# Altium schematic symbol library 13-Logicold 逻辑 IC.SchLib: 297 symbols (part 5 of 30)
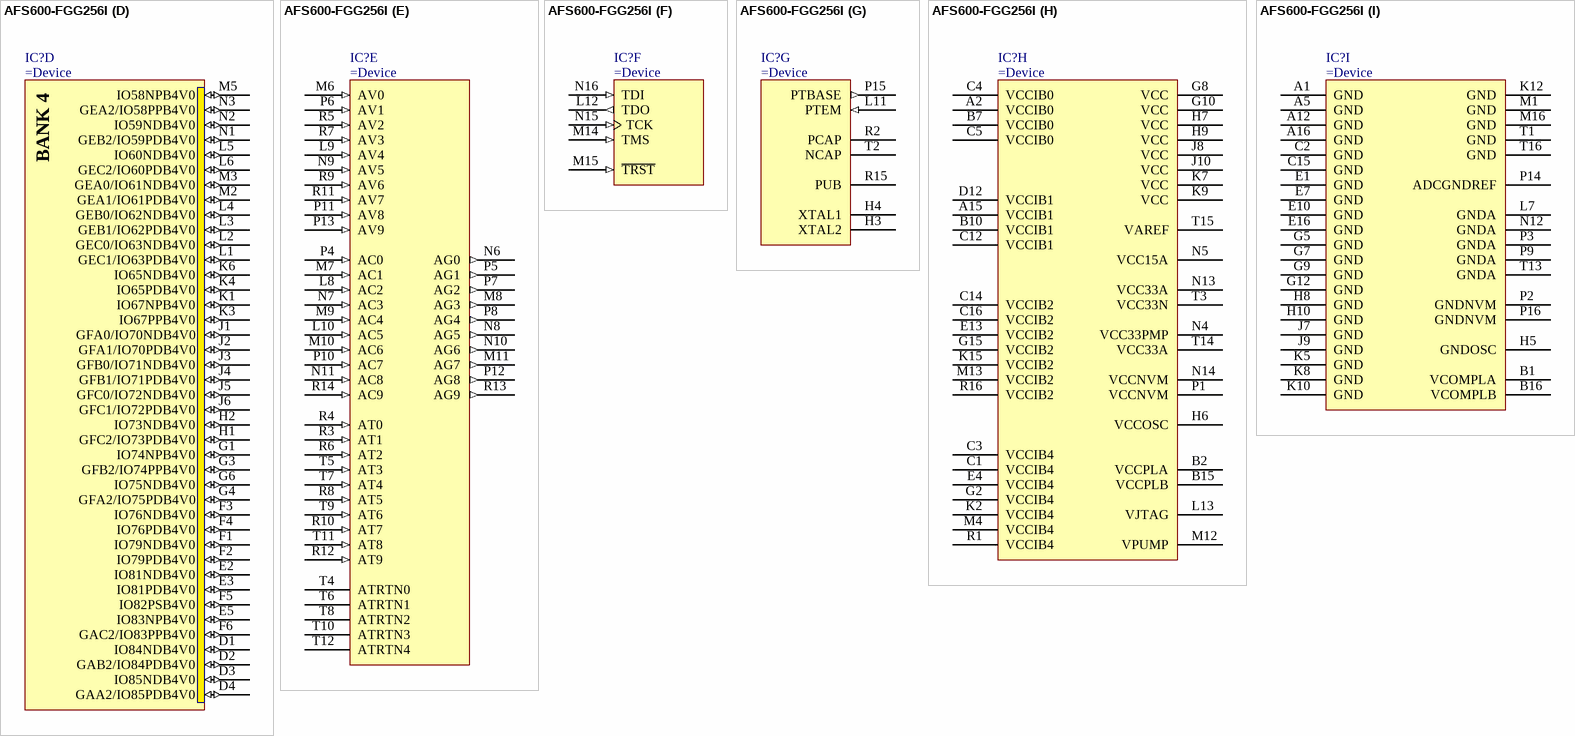
[diagram p166: symbol AFS600-FGG256I]

## AFS600-FGG256I
designator IC?
3.3V Fusion Mixed Signal Flash FPGA, 600,000 System Gates, 256-Pin FBGA, Industrial Grade, Pb-Free
part A pins: A3 GAA0/IO01NDB0V0 (io), A4 GAA1/IO01PDB0V0 (io), A6 IO10PDB0V1 (io), A7 IO12PDB0V1 (io), A8 IO12NDB0V1 (io), B3 IO00NDB0V0 (io), B4 IO00PDB0V0 (io), B5 GAB1/IO02PPB0V0 (io), B6 IO10NDB0V1 (io), C6 GAC1/IO03PDB0V0 (io), C7 IO06NDB0V0 (io), D5 GAB0/IO02NPB0V0 (io), D6 GAC0/IO03NDB0V0 (io), D7 IO06PDB0V0 (io), D8 IO14NDB0V1 (io), D9 IO14PDB0V1 (io), E6 IO04NPB0V0 (io), E8 IO08PDB0V1 (io), F7 IO04PPB0V0 (io), F8 IO08NDB0V1 (io)
part B pins: A9 IO22NDB1V0 (io), A10 IO22PDB1V0 (io), A11 IO24NDB1V1 (io), A13 GBA0/IO28NDB1V1 (io), A14 IO29NDB1V1 (io), B8 IO18NDB1V0 (io), B9 IO18PDB1V0 (io), B11 IO24PDB1V1 (io), B12 GBC0/IO26NPB1V1 (io), B13 GBA1/IO28PDB1V1 (io), B14 IO29PDB1V1 (io), C8 IO16PDB1V0 (io), C9 IO16NDB1V0 (io), C10 IO25NDB1V1 (io), C11 IO25PDB1V1 (io), C13 GBC1/IO26PPB1V1 (io), D10 IO23PDB1V1 (io), D11 GBB0/IO27NDB1V1 (io), E9 IO20NDB1V0 (io), E11 GBB1/IO27PDB1V1 (io), F9 IO20PDB1V0 (io), F10 IO23NDB1V1 (io)
part C pins: D13 GBA2/IO30PDB2V0 (io), D14 IO30NDB2V0 (io), D15 GBB2/IO31PDB2V0 (io), D16 IO31NDB2V0 (io), E12 IO33PSB2V0 (io), E14 IO32NDB2V0 (io), E15 GBC2/IO32PDB2V0 (io), F11 IO36NDB2V0 (io), F12 IO36PDB2V0 (io), F13 IO39NDB2V0 (io), F14 GCA2/IO39PDB2V0 (io), F15 GCB2/IO40PDB2V0 (io), F16 IO40NDB2V0 (io), G11 GCC0/IO43NDB2V0 (io), G13 GCC1/IO43PDB2V0 (io), G14 IO41NPB2V0 (io), G16 GCC2/IO41PPB2V0 (io), H11 IO47NDB2V0 (io), H12 IO47PDB2V0 (io), H13 GCA1/IO45PDB2V0 (io), H14 GCA0/IO45NDB2V0 (io), H15 GCB0/IO44NDB2V0 (io), H16 GCB1/IO44PDB2V0 (io), J11 IO56NPB2V0 (io), J12 GDB0/IO53NPB2V0 (io), J13 GDA1/IO54PDB2V0 (io), J14 GDC1/IO52PPB2V0 (io), J15 IO51NSB2V0 (io), J16 GDC0/IO52NPB2V0 (io), K11 GDC2/IO57PPB2V0 (io), K13 GDA0/IO54NDB2V0 (io), K14 GDA2/IO55PPB2V0 (io), K16 GDB1/IO53PPB2V0 (io), L14 IO57NPB2V0 (io), L15 GDB2/IO56PPB2V0 (io), L16 IO55NPB2V0 (io)
part D pins: D1 IO84NDB4V0 (io), D2 GAB2/IO84PDB4V0 (io), D3 IO85NDB4V0 (io), D4 GAA2/IO85PDB4V0 (io), E2 IO81NDB4V0 (io), E3 IO81PDB4V0 (io), E5 IO83NPB4V0 (io), F1 IO79NDB4V0 (io), F2 IO79PDB4V0 (io), F3 IO76NDB4V0 (io), F4 IO76PDB4V0 (io), F5 IO82PSB4V0 (io), F6 GAC2/IO83PPB4V0 (io), G1 IO74NPB4V0 (io), G3 GFB2/IO74PPB4V0 (io), G4 GFA2/IO75PDB4V0 (io), G6 IO75NDB4V0 (io), H1 GFC2/IO73PDB4V0 (io), H2 IO73NDB4V0 (io), J1 GFA0/IO70NDB4V0 (io), J2 GFA1/IO70PDB4V0 (io), J3 GFB0/IO71NDB4V0 (io), J4 GFB1/IO71PDB4V0 (io), J5 GFC0/IO72NDB4V0 (io), J6 GFC1/IO72PDB4V0 (io), K1 IO67NPB4V0 (io), K3 IO67PPB4V0 (io), K4 IO65PDB4V0 (io), K6 IO65NDB4V0 (io), L1 GEC1/IO63PDB4V0 (io), L2 GEC0/IO63NDB4V0 (io), L3 GEB1/IO62PDB4V0 (io), L4 GEB0/IO62NDB4V0 (io), L5 IO60NDB4V0 (io), L6 GEC2/IO60PDB4V0 (io), M2 GEA1/IO61PDB4V0 (io), M3 GEA0/IO61NDB4V0 (io), M5 IO58NPB4V0 (io), N1 GEB2/IO59PDB4V0 (io), N2 IO59NDB4V0 (io), N3 GEA2/IO58PPB4V0 (io)
part E pins: L8 AC2 (in) "Analog current pad 2.", L9 AV4 (in) "Analog voltage pad 4.", L10 AC5 (in) "Analog current pad 5.", M6 AV0 (in) "Analog voltage pad 0.", M7 AC1 (in) "Analog current pad 1.", M8 AG3 (out) "Analog gate driver pad 3.", M9 AC4 (in) "Analog current pad 4.", M10 AC6 (in) "Analog current pad 6.", M11 AG7 (out) "Analog gate driver pad 7.", N6 AG0 (out) "Analog gate driver pad 0.", N7 AC3 (in) "Analog current pad 3.", N8 AG5 (out) "Analog gate driver pad 5.", N9 AV5 (in) "Analog voltage pad 5.", N10 AG6 (out) "Analog gate driver pad 6.", N11 AC8 (in) "Analog current pad 8.", P4 AC0 (in) "Analog current pad 0.", P5 AG1 (out) "Analog gate driver pad 1.", P6 AV1 (in) "Analog voltage pad 1.", P7 AG2 (out) "Analog gate driver pad 2.", P8 AG4 (out) "Analog gate driver pad 4.", P10 AC7 (in) "Analog current pad 7.", P11 AV8 (in) "Analog voltage pad 8.", P12 AG8 (out) "Analog gate driver pad 8.", P13 AV9 (in) "Analog voltage pad 9.", R3 AT1 (in) "Analog temperature pad 1.", R4 AT0 (in) "Analog temperature pad 0.", R5 AV2 (in) "Analog voltage pad 2.", R6 AT2 (in) "Analog temperature pad 2.", R7 AV3 (in) "Analog voltage pad 3.", R8 AT5 (in) "Analog temperature pad 5.", R9 AV6 (in) "Analog voltage pad 6.", R10 AT7 (in) "Analog temperature pad 7.", R11 AV7 (in) "Analog voltage pad 7.", R12 AT9 (in) "Analog temperature pad 9.", R13 AG9 (out) "Analog gate driver pad 9.", R14 AC9 (in) "Analog current pad 9.", T4 ATRTN0 "Temperature monitor return 0.", T5 AT3 (in) "Analog temperature pad 3.", T6 ATRTN1 "Temperature monitor return 1.", T7 AT4 (in) "Analog temperature pad 4.", T8 ATRTN2 "Temperature monitor return 2.", T9 AT6 (in) "Analog temperature pad 6.", T10 ATRTN3 "Temperature monitor return 3.", T11 AT8 (in) "Analog temperature pad 8.", T12 ATRTN4 "Temperature monitor return 4."
part F pins: L12 TDO (out), M14 TMS (in), M15 ~{TRST} (in), N15 TCK (in), N16 TDI (in)
part G pins: H3 XTAL2 "Input to crystal oscillator - If using external RC network or clock input, XTAL1 should be used and XTAL2 left unconnected.", H4 XTAL1 "Input to crystal oscillator - If using external RC network or clock input, XTAL1 should be used and XTAL2 left unconnected.", L11 PTEM (in) "PASS TRANSISTOR EMITTER - The feedback input of the voltage regulator.", P15 PTBASE (out) "PASS TRANSISTOR BASE - The control signal of the voltage regulator.", R2 PCAP "POSITIVE CAPACITOR - where the positive terminal of the charge pump capacitor is connected.", R15 PUB "Power up bar - for the external momentary switch which turns on the 1.5V regulator.", T2 NCAP "NEGATIVE CAPACITOR - where the negative terminal of the charge pump capacitor is connected."
part H pins: A2 VCCIB0 (power), A15 VCCIB1 (power), B2 VCCPLA (power), B7 VCCIB0 (power), B10 VCCIB1 (power), B15 VCCPLB (power), C1 VCCIB4 (power), C3 VCCIB4 (power) "Quiet supply voltage to the input buffers of bank 4.", C4 VCCIB0 (power) "Quiet supply voltage to the input buffers of bank 0.", C5 VCCIB0 (power), C12 VCCIB1 (power), C14 VCCIB2 (power) "Quiet supply voltage to the input buffers of bank 2.", C16 VCCIB2 (power), D12 VCCIB1 (power) "Quiet supply voltage to the input buffers of bank 1.", E4 VCCIB4 (power), E13 VCCIB2 (power), G2 VCCIB4 (power), G8 VCC (power), G10 VCC (power), G15 VCCIB2 (power), H6 VCCOSC (power), H7 VCC (power), H9 VCC (power), J8 VCC (power), J10 VCC (power), K2 VCCIB4 (power), K7 VCC (power), K9 VCC (power), K15 VCCIB2 (power), L13 VJTAG (power), M4 VCCIB4 (power), M12 VPUMP (power), M13 VCCIB2 (power), N4 VCC33PMP (power) "3.3V clean analog power supply input for use by the analog charge pump.", N5 VCC15A (power), N13 VCC33A (power), N14 VCCNVM (power) "1.5V power supply used by the Fusion device's Flash memory block module(s).", P1 VCCNVM (power) "1.5V power supply used by the Fusion device's Flash memory block module(s).", R1 VCCIB4 (power), R16 VCCIB2 (power), T3 VCC33N (power) "-3.3V output from the voltage converter. A 2.2µF capacitor must be connected from this pin to ground.", T14 VCC33A (power) "Analog power pin for the analog power supply low pass filter. An external 1µF capacitor should be connected between this pin and ground.", T15 VAREF (power) "Analog reference voltage to be used by analog to digital converter."
part I pins: A1 GND (power), A5 GND (power), A12 GND (power), A16 GND (power), B1 VCOMPLA (power), B16 VCOMPLB (power), C2 GND (power), C15 GND (power), E1 GND (power), E7 GND (power), E10 GND (power), E16 GND (power), G5 GND (power), G7 GND (power), G9 GND (power), G12 GND (power), H5 GNDOSC (power) "Oscillator ground.", H8 GND (power), H10 GND (power), J7 GND (power), J9 GND (power), K5 GND (power), K8 GND (power), K10 GND (power), K12 GND (power), L7 GNDA (power), M1 GND (power), M16 GND (power), N12 GNDA (power), P2 GNDNVM (power) "Flash memory ground.", P3 GNDA (power), P9 GNDA (power), P14 ADCGNDREF (power) "Analog ground reference used by the ADC.", P16 GNDNVM (power) "Flash memory ground.", T1 GND (power), T13 GNDA (power), T16 GND (power)
part A text: BANK 0
part B text: BANK 1
part C text: BANK 2
part D text: BANK 4

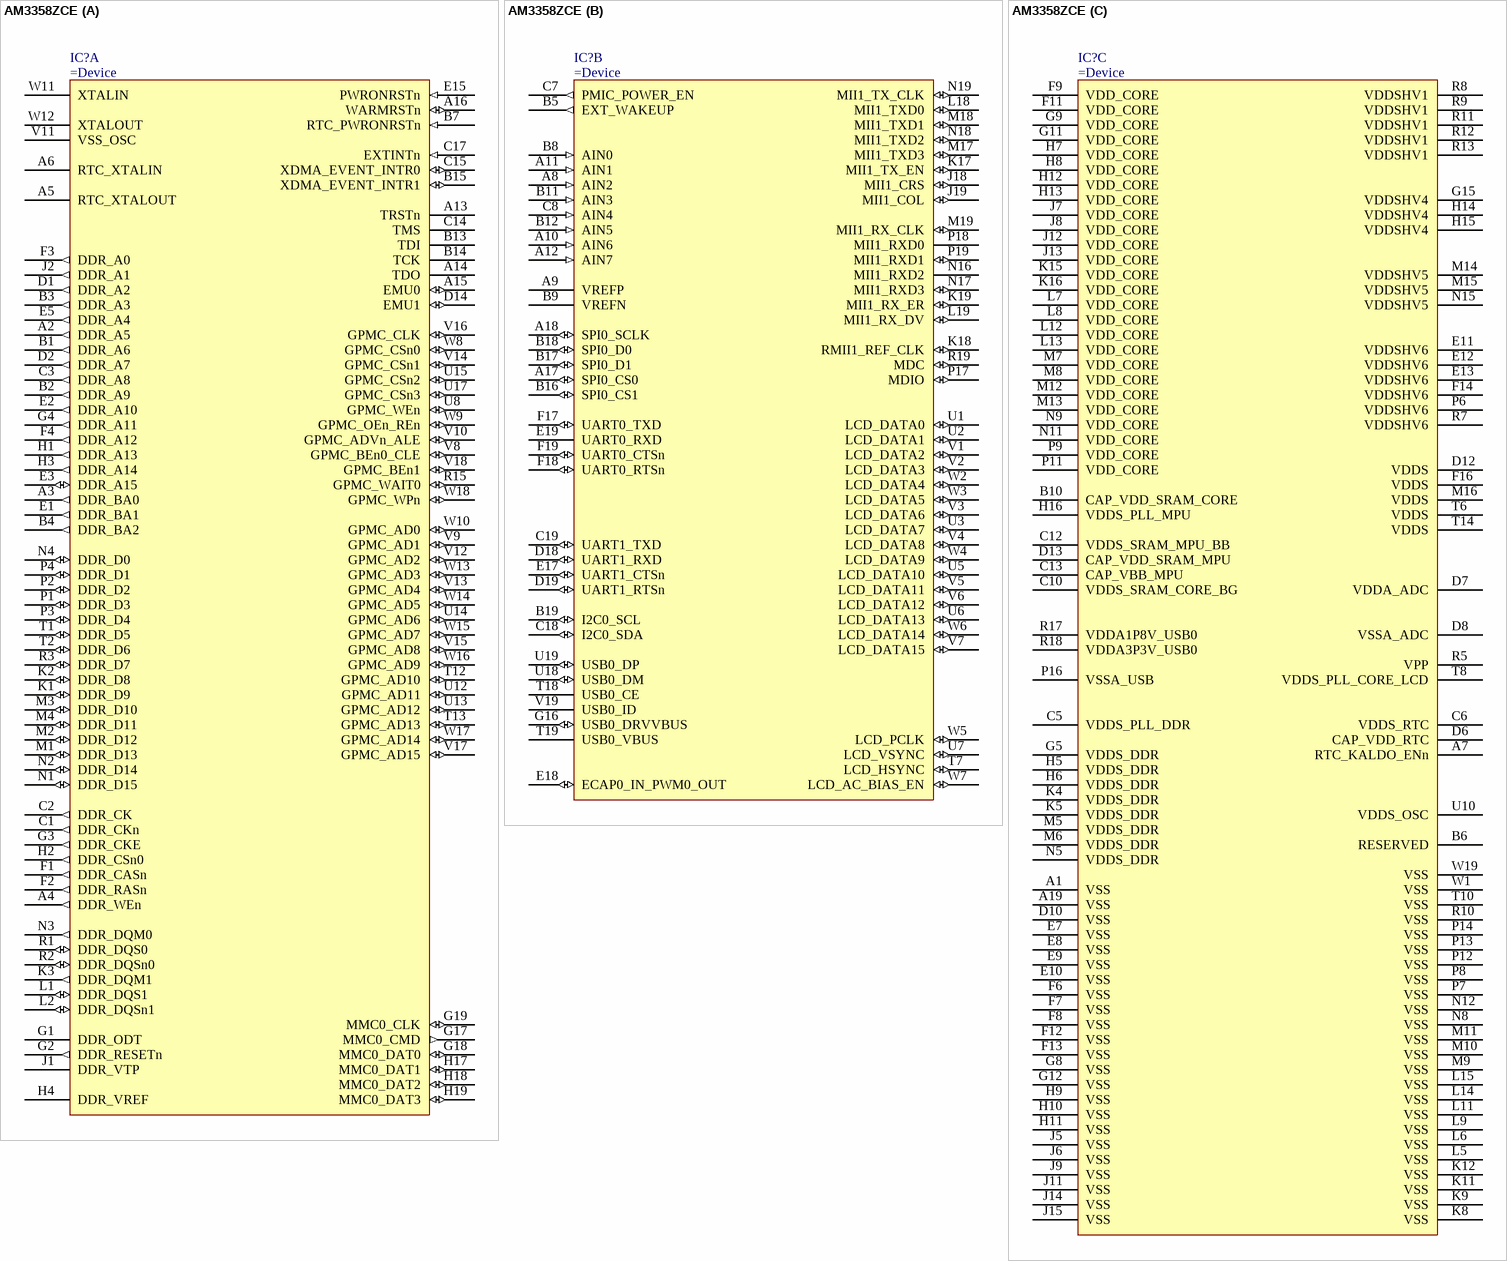
[diagram p26: symbol AM3358ZCE]

## AM3358ZCE
designator IC?
SubArctic Cortex A8 Processor
part A pins: A2 DDR_A5 (out), A3 DDR_BA0 (out), A4 DDR_WEn (out), A5 RTC_XTALOUT, A6 RTC_XTALIN, A13 TRSTn, A14 TDO, A15 EMU0 (io), A16 WARMRSTn (io), B1 DDR_A6 (out), B2 DDR_A9 (out), B3 DDR_A3 (out), B4 DDR_BA2 (out), B7 RTC_PWRONRSTn (in), B13 TDI, B14 TCK, B15 XDMA_EVENT_INTR1 (io), C1 DDR_CKn (out), C2 DDR_CK (out), C3 DDR_A8 (out), C14 TMS, C15 XDMA_EVENT_INTR0 (io), C17 EXTINTn (in), D1 DDR_A2 (out), D2 DDR_A7 (out), D14 EMU1 (io), E1 DDR_BA1 (out), E2 DDR_A10 (out), E3 DDR_A15 (io), E5 DDR_A4 (out), E15 PWRONRSTn (in), F1 DDR_CASn (out), F2 DDR_RASn (out), F3 DDR_A0 (out), F4 DDR_A12 (out), G1 DDR_ODT, G2 DDR_RESETn (out), G3 DDR_CKE (out), G4 DDR_A11 (out), G17 MMC0_CMD (out), G18 MMC0_DAT0 (io), G19 MMC0_CLK (io), H1 DDR_A13 (out), H2 DDR_CSn0 (out), H3 DDR_A14 (out), H4 DDR_VREF, H17 MMC0_DAT1 (io), H18 MMC0_DAT2 (io), H19 MMC0_DAT3 (io), J1 DDR_VTP, J2 DDR_A1 (out), K1 DDR_D9 (io), K2 DDR_D8 (io), K3 DDR_DQM1 (out), L1 DDR_DQS1 (io), L2 DDR_DQSn1 (io), M1 DDR_D13 (io), M2 DDR_D12 (io), M3 DDR_D10 (io), M4 DDR_D11 (io), N1 DDR_D15 (io), N2 DDR_D14 (io), N3 DDR_DQM0 (out), N4 DDR_D0 (io), P1 DDR_D3 (io), P2 DDR_D2 (io), P3 DDR_D4 (io), P4 DDR_D1 (io), R1 DDR_DQS0 (io), R2 DDR_DQSn0 (io), R3 DDR_D7 (io), R15 GPMC_WAIT0 (io), T1 DDR_D5 (io), T2 DDR_D6 (io), T12 GPMC_AD10 (io), T13 GPMC_AD13 (io), U8 GPMC_WEn (io), U12 GPMC_AD11 (io), U13 GPMC_AD12 (io), U14 GPMC_AD6 (io), U15 GPMC_CSn2 (io), U17 GPMC_CSn3 (io), V8 GPMC_BEn0_CLE (io), V9 GPMC_AD1 (io), V10 GPMC_ADVn_ALE (io), V11 VSS_OSC (power), V12 GPMC_AD2 (io), V13 GPMC_AD4 (io), V14 GPMC_CSn1 (io), V15 GPMC_AD8 (io), V16 GPMC_CLK (io), V17 GPMC_AD15 (io), V18 GPMC_BEn1 (io), W8 GPMC_CSn0 (io), W9 GPMC_OEn_REn (io), W10 GPMC_AD0 (io), W11 XTALIN, W12 XTALOUT, W13 GPMC_AD3 (io), W14 GPMC_AD5 (io), W15 GPMC_AD7 (io), W16 GPMC_AD9 (io), W17 GPMC_AD14 (io), W18 GPMC_WPn (io)
part B pins: A8 AIN2 (in), A9 VREFP, A10 AIN6 (in), A11 AIN1 (in), A12 AIN7 (in), A17 SPI0_CS0 (io), A18 SPI0_SCLK (io), B5 EXT_WAKEUP (out), B8 AIN0 (in), B9 VREFN, B11 AIN3 (in), B12 AIN5 (in), B16 SPI0_CS1 (io), B17 SPI0_D1 (io), B18 SPI0_D0 (io), B19 I2C0_SCL (io), C7 PMIC_POWER_EN (out), C8 AIN4 (in), C18 I2C0_SDA (io), C19 UART1_TXD (io), D18 UART1_RXD (io), D19 UART1_RTSn (io), E17 UART1_CTSn (io), E18 ECAP0_IN_PWM0_OUT (io), E19 UART0_RXD, F17 UART0_TXD (io), F18 UART0_RTSn (io), F19 UART0_CTSn (io), G16 USB0_DRVVBUS (io), J18 MII1_CRS (io), J19 MII1_COL (io), K17 MII1_TX_EN (io), K18 RMII1_REF_CLK (io), K19 MII1_RX_ER (io), L18 MII1_TXD0 (io), L19 MII1_RX_DV (io), M17 MII1_TXD3 (io), M18 MII1_TXD1 (io), M19 MII1_RX_CLK (io), N16 MII1_RXD2, N17 MII1_RXD3 (io), N18 MII1_TXD2 (io), N19 MII1_TX_CLK (io), P17 MDIO (io), P18 MII1_RXD0, P19 MII1_RXD1 (io), R19 MDC (io), T7 LCD_HSYNC (io), T18 USB0_CE, T19 USB0_VBUS, U1 LCD_DATA0 (io), U2 LCD_DATA1 (io), U3 LCD_DATA7 (io), U5 LCD_DATA10 (io), U6 LCD_DATA13 (io), U7 LCD_VSYNC (io), U18 USB0_DM (io), U19 USB0_DP (io), V1 LCD_DATA2 (io), V2 LCD_DATA3 (io), V3 LCD_DATA6 (io), V4 LCD_DATA8 (io), V5 LCD_DATA11 (io), V6 LCD_DATA12 (io), V7 LCD_DATA15 (io), V19 USB0_ID, W2 LCD_DATA4 (io), W3 LCD_DATA5 (io), W4 LCD_DATA9 (io), W5 LCD_PCLK (io), W6 LCD_DATA14 (io), W7 LCD_AC_BIAS_EN (io)
part C pins: A1 VSS (power), A7 RTC_KALDO_ENn (power), A19 VSS (power), B6 RESERVED, B10 CAP_VDD_SRAM_CORE (power), C5 VDDS_PLL_DDR (power), C6 VDDS_RTC (power), C10 VDDS_SRAM_CORE_BG (power), C12 VDDS_SRAM_MPU_BB (power), C13 CAP_VBB_MPU (power), D6 CAP_VDD_RTC (power), D7 VDDA_ADC (power), D8 VSSA_ADC (power), D10 VSS (power), D12 VDDS (power), D13 CAP_VDD_SRAM_MPU (power), E7 VSS (power), E8 VSS (power), E9 VSS (power), E10 VSS (power), E11 VDDSHV6 (power), E12 VDDSHV6 (power), E13 VDDSHV6 (power), F6 VSS (power), F7 VSS (power), F8 VSS (power), F9 VDD_CORE (power), F11 VDD_CORE (power), F12 VSS (power), F13 VSS (power), F14 VDDSHV6 (power), F16 VDDS (power), G5 VDDS_DDR (power), G8 VSS (power), G9 VDD_CORE (power), G11 VDD_CORE (power), G12 VSS (power), G15 VDDSHV4 (power), H5 VDDS_DDR (power), H6 VDDS_DDR (power), H7 VDD_CORE (power), H8 VDD_CORE (power), H9 VSS (power), H10 VSS (power), H11 VSS (power), H12 VDD_CORE (power), H13 VDD_CORE (power), H14 VDDSHV4 (power), H15 VDDSHV4 (power), H16 VDDS_PLL_MPU (power), J5 VSS (power), J6 VSS (power), J7 VDD_CORE (power), J8 VDD_CORE (power), J9 VSS (power), J11 VSS (power), J12 VDD_CORE (power), J13 VDD_CORE (power), J14 VSS (power), J15 VSS (power), K4 VDDS_DDR (power), K5 VDDS_DDR (power), K8 VSS (power), K9 VSS (power), K11 VSS (power), K12 VSS (power), K15 VDD_CORE (power), K16 VDD_CORE (power), L5 VSS (power), L6 VSS (power), L7 VDD_CORE (power), L8 VDD_CORE (power), L9 VSS (power), L11 VSS (power), L12 VDD_CORE (power), L13 VDD_CORE (power), L14 VSS (power), L15 VSS (power), M5 VDDS_DDR (power), M6 VDDS_DDR (power), M7 VDD_CORE (power), M8 VDD_CORE (power), M9 VSS (power), M10 VSS (power), M11 VSS (power), M12 VDD_CORE (power), M13 VDD_CORE (power), M14 VDDSHV5 (power), M15 VDDSHV5 (power), M16 VDDS (power), N5 VDDS_DDR (power), N8 VSS (power), N9 VDD_CORE (power), N11 VDD_CORE (power), N12 VSS (power), N15 VDDSHV5 (power), P6 VDDSHV6 (power), P7 VSS (power), P8 VSS (power), P9 VDD_CORE (power), P11 VDD_CORE (power), P12 VSS (power), P13 VSS (power), P14 VSS (power), P16 VSSA_USB (power), R5 VPP (power), R7 VDDSHV6 (power), R8 VDDSHV1 (power), R9 VDDSHV1 (power), R10 VSS (power), R11 VDDSHV1 (power), R12 VDDSHV1 (power), R13 VDDSHV1 (power), R17 VDDA1P8V_USB0 (power), R18 VDDA3P3V_USB0 (power), T6 VDDS (power), T8 VDDS_PLL_CORE_LCD (power), T10 VSS (power), T14 VDDS (power), U10 VDDS_OSC (power), W1 VSS (power), W19 VSS (power)

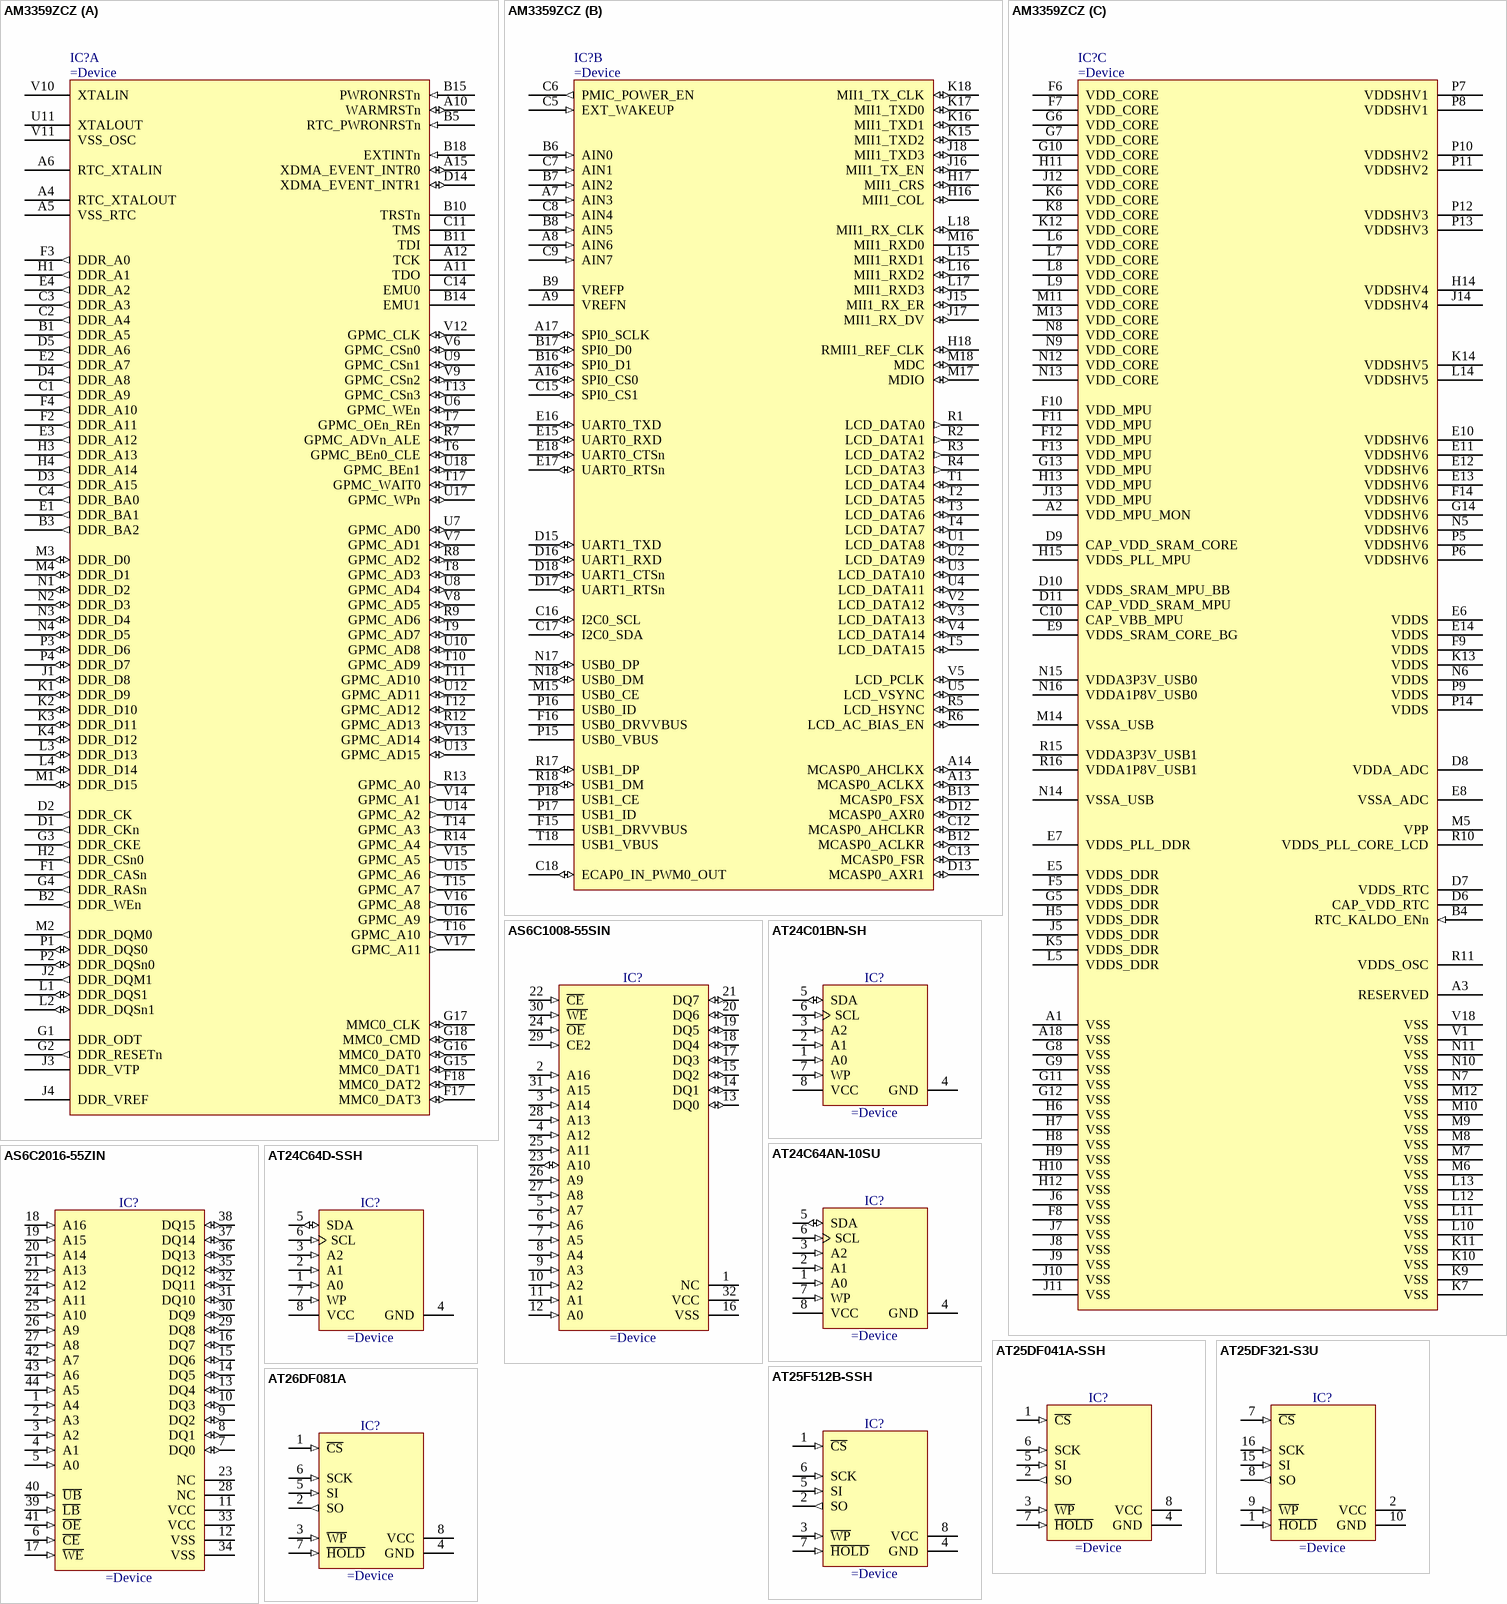
[diagram p27: symbols AM3359ZCZ to AT26DF081A]

## AM3359ZCZ
designator IC?
SubArctic Cortex A8 Processor
part A pins: A4 RTC_XTALOUT, A5 VSS_RTC (power), A6 RTC_XTALIN, A10 WARMRSTn (io), A11 TDO, A12 TCK, A15 XDMA_EVENT_INTR0 (io), B1 DDR_A5 (out), B2 DDR_WEn (out), B3 DDR_BA2 (out), B5 RTC_PWRONRSTn (in), B10 TRSTn, B11 TDI, B14 EMU1, B15 PWRONRSTn (in), B18 EXTINTn (in), C1 DDR_A9 (out), C2 DDR_A4 (out), C3 DDR_A3 (out), C4 DDR_BA0 (out), C11 TMS, C14 EMU0, D1 DDR_CKn (out), D2 DDR_CK (out), D3 DDR_A15 (out), D4 DDR_A8 (out), D5 DDR_A6 (out), D14 XDMA_EVENT_INTR1 (io), E1 DDR_BA1 (out), E2 DDR_A7 (out), E3 DDR_A12 (out), E4 DDR_A2 (out), F1 DDR_CASn (out), F2 DDR_A11 (out), F3 DDR_A0 (out), F4 DDR_A10 (out), F17 MMC0_DAT3 (io), F18 MMC0_DAT2 (io), G1 DDR_ODT, G2 DDR_RESETn (out), G3 DDR_CKE (out), G4 DDR_RASn (out), G15 MMC0_DAT1 (io), G16 MMC0_DAT0 (io), G17 MMC0_CLK (io), G18 MMC0_CMD (io), H1 DDR_A1 (out), H2 DDR_CSn0 (out), H3 DDR_A13 (out), H4 DDR_A14 (out), J1 DDR_D8 (io), J2 DDR_DQM1 (out), J3 DDR_VTP, J4 DDR_VREF, K1 DDR_D9 (io), K2 DDR_D10 (io), K3 DDR_D11 (io), K4 DDR_D12 (io), L1 DDR_DQS1 (io), L2 DDR_DQSn1 (io), L3 DDR_D13 (io), L4 DDR_D14 (io), M1 DDR_D15 (io), M2 DDR_DQM0 (out), M3 DDR_D0 (io), M4 DDR_D1 (io), N1 DDR_D2 (io), N2 DDR_D3 (io), N3 DDR_D4 (io), N4 DDR_D5 (io), P1 DDR_DQS0 (io), P2 DDR_DQSn0 (io), P3 DDR_D6 (io), P4 DDR_D7 (io), R7 GPMC_ADVn_ALE (io), R8 GPMC_AD2 (io), R9 GPMC_AD6 (io), R12 GPMC_AD13 (io), R13 GPMC_A0 (out), R14 GPMC_A4 (out), T6 GPMC_BEn0_CLE (io), T7 GPMC_OEn_REn (io), T8 GPMC_AD3 (io), T9 GPMC_AD7 (io), T10 GPMC_AD9 (io), T11 GPMC_AD10 (io), T12 GPMC_AD12 (io), T13 GPMC_CSn3 (io), T14 GPMC_A3 (out), T15 GPMC_A7 (out), T16 GPMC_A10 (out), T17 GPMC_WAIT0 (io), U6 GPMC_WEn (io), U7 GPMC_AD0 (io), U8 GPMC_AD4 (io), U9 GPMC_CSn1 (io), U10 GPMC_AD8 (io), U11 XTALOUT, U12 GPMC_AD11 (io), U13 GPMC_AD15 (io), U14 GPMC_A2 (out), U15 GPMC_A6 (out), U16 GPMC_A9 (out), U17 GPMC_WPn (io), U18 GPMC_BEn1 (io), V6 GPMC_CSn0 (io), V7 GPMC_AD1 (io), V8 GPMC_AD5 (io), V9 GPMC_CSn2 (io), V10 XTALIN, V11 VSS_OSC (power), V12 GPMC_CLK (io), V13 GPMC_AD14 (io), V14 GPMC_A1 (out), V15 GPMC_A5 (out), V16 GPMC_A8 (out), V17 GPMC_A11 (out)
part B pins: A7 AIN3 (in), A8 AIN6 (in), A9 VREFN, A13 MCASP0_ACLKX (io), A14 MCASP0_AHCLKX (io), A16 SPI0_CS0 (io), A17 SPI0_SCLK (io), B6 AIN0 (in), B7 AIN2 (in), B8 AIN5 (in), B9 VREFP, B12 MCASP0_ACLKR (io), B13 MCASP0_FSX (io), B16 SPI0_D1 (io), B17 SPI0_D0 (io), C5 EXT_WAKEUP (in), C6 PMIC_POWER_EN (out), C7 AIN1 (in), C8 AIN4 (in), C9 AIN7 (in), C12 MCASP0_AHCLKR (io), C13 MCASP0_FSR (io), C15 SPI0_CS1 (io), C16 I2C0_SCL (io), C17 I2C0_SDA (io), C18 ECAP0_IN_PWM0_OUT (io), D12 MCASP0_AXR0 (io), D13 MCASP0_AXR1 (io), D15 UART1_TXD (io), D16 UART1_RXD (io), D17 UART1_RTSn (io), D18 UART1_CTSn (io), E15 UART0_RXD (io), E16 UART0_TXD (io), E17 UART0_RTSn (io), E18 UART0_CTSn (io), F15 USB1_DRVVBUS, F16 USB0_DRVVBUS, H16 MII1_COL (io), H17 MII1_CRS (io), H18 RMII1_REF_CLK (io), J15 MII1_RX_ER (io), J16 MII1_TX_EN (io), J17 MII1_RX_DV (io), J18 MII1_TXD3 (io), K15 MII1_TXD2 (io), K16 MII1_TXD1 (io), K17 MII1_TXD0 (io), K18 MII1_TX_CLK (io), L15 MII1_RXD1 (io), L16 MII1_RXD2 (io), L17 MII1_RXD3 (io), L18 MII1_RX_CLK (io), M15 USB0_CE, M16 MII1_RXD0, M17 MDIO (io), M18 MDC (io), N17 USB0_DP (io), N18 USB0_DM (io), P15 USB0_VBUS, P16 USB0_ID, P17 USB1_ID, P18 USB1_CE, R1 LCD_DATA0 (out), R2 LCD_DATA1 (out), R3 LCD_DATA2 (out), R4 LCD_DATA3 (out), R5 LCD_HSYNC (io), R6 LCD_AC_BIAS_EN (io), R17 USB1_DP (io), R18 USB1_DM (io), T1 LCD_DATA4 (io), T2 LCD_DATA5 (io), T3 LCD_DATA6 (io), T4 LCD_DATA7 (io), T5 LCD_DATA15 (io), T18 USB1_VBUS, U1 LCD_DATA8 (io), U2 LCD_DATA9 (io), U3 LCD_DATA10 (io), U4 LCD_DATA11 (io), U5 LCD_VSYNC (io), V2 LCD_DATA12 (io), V3 LCD_DATA13 (io), V4 LCD_DATA14 (io), V5 LCD_PCLK (io)
part C pins: A1 VSS (power), A2 VDD_MPU_MON, A3 RESERVED, A18 VSS (power), B4 RTC_KALDO_ENn (in), C10 CAP_VBB_MPU, D6 CAP_VDD_RTC (power), D7 VDDS_RTC (power), D8 VDDA_ADC (power), D9 CAP_VDD_SRAM_CORE (power), D10 VDDS_SRAM_MPU_BB (power), D11 CAP_VDD_SRAM_MPU (power), E5 VDDS_DDR (power), E6 VDDS (power), E7 VDDS_PLL_DDR (power), E8 VSSA_ADC (power), E9 VDDS_SRAM_CORE_BG (power), E10 VDDSHV6 (power), E11 VDDSHV6 (power), E12 VDDSHV6 (power), E13 VDDSHV6 (power), E14 VDDS (power), F5 VDDS_DDR (power), F6 VDD_CORE (power), F7 VDD_CORE (power), F8 VSS (power), F9 VDDS (power), F10 VDD_MPU (power), F11 VDD_MPU (power), F12 VDD_MPU (power), F13 VDD_MPU (power), F14 VDDSHV6 (power), G5 VDDS_DDR (power), G6 VDD_CORE (power), G7 VDD_CORE (power), G8 VSS (power), G9 VSS (power), G10 VDD_CORE (power), G11 VSS (power), G12 VSS (power), G13 VDD_MPU (power), G14 VDDSHV6 (power), H5 VDDS_DDR (power), H6 VSS (power), H7 VSS (power), H8 VSS (power), H9 VSS (power), H10 VSS (power), H11 VDD_CORE (power), H12 VSS (power), H13 VDD_MPU (power), H14 VDDSHV4 (power), H15 VDDS_PLL_MPU (power), J5 VDDS_DDR (power), J6 VSS (power), J7 VSS (power), J8 VSS (power), J9 VSS (power), J10 VSS (power), J11 VSS (power), J12 VDD_CORE (power), J13 VDD_MPU (power), J14 VDDSHV4 (power), K5 VDDS_DDR (power), K6 VDD_CORE (power), K7 VSS (power), K8 VDD_CORE (power), K9 VSS (power), K10 VSS (power), K11 VSS (power), K12 VDD_CORE (power), K13 VDDS (power), K14 VDDSHV5 (power), L5 VDDS_DDR (power), L6 VDD_CORE (power), L7 VDD_CORE (power), L8 VDD_CORE (power), L9 VDD_CORE (power), L10 VSS (power), L11 VSS (power), L12 VSS (power), L13 VSS (power), L14 VDDSHV5 (power), M5 VPP (power), M6 VSS (power), M7 VSS (power), M8 VSS (power), M9 VSS (power), M10 VSS (power), M11 VDD_CORE (power), M12 VSS (power), M13 VDD_CORE (power), M14 VSSA_USB (power), N5 VDDSHV6 (power), N6 VDDS (power), N7 VSS (power), N8 VDD_CORE (power), N9 VDD_CORE (power), N10 VSS (power), N11 VSS (power), N12 VDD_CORE (power), N13 VDD_CORE (power), N14 VSSA_USB (power), N15 VDDA3P3V_USB0 (power), N16 VDDA1P8V_USB0 (power), P5 VDDSHV6 (power), P6 VDDSHV6 (power), P7 VDDSHV1 (power), P8 VDDSHV1 (power), P9 VDDS (power), P10 VDDSHV2 (power), P11 VDDSHV2 (power), P12 VDDSHV3 (power), P13 VDDSHV3 (power), P14 VDDS (power), R10 VDDS_PLL_CORE_LCD (power), R11 VDDS_OSC (power), R15 VDDA3P3V_USB1 (power), R16 VDDA1P8V_USB1 (power), V1 VSS (power), V18 VSS (power)

## AS6C1008-55SIN
designator IC?
2.7V-5V Low Power 128K x 8 CMOS Static RAM
pins: 1 NC, 2 A16 (in), 3 A14 (in), 4 A12 (in), 5 A7 (in), 6 A6 (in), 7 A5 (in), 8 A4 (in), 9 A3 (in), 10 A2 (in), 11 A1 (in), 12 A0 (in), 13 DQ0 (io), 14 DQ1 (io), 15 DQ2 (io), 16 VSS (power), 17 DQ3 (io), 18 DQ4 (io), 19 DQ5 (io), 20 DQ6 (io), 21 DQ7 (io), 22 ~{CE} (in), 23 A10 (io), 24 ~{OE} (in), 25 A11 (in), 26 A9 (in), 27 A8 (in), 28 A13 (in), 29 CE2 (in), 30 ~{WE} (in), 31 A15 (in), 32 VCC (power)

## AS6C2016-55ZIN
designator IC?
2.7V-5V Low Power 128K x 16 Bit CMOS SRAM
pins: 1 A4 (in), 2 A3 (in), 3 A2 (in), 4 A1 (in), 5 A0 (in), 6 ~{CE} (in), 7 DQ0 (io), 8 DQ1 (io), 9 DQ2 (io), 10 DQ3 (io), 11 VCC (power), 12 VSS (power), 13 DQ4 (io), 14 DQ5 (io), 15 DQ6 (io), 16 DQ7 (io), 17 ~{WE} (in), 18 A16 (in), 19 A15 (in), 20 A14 (in), 21 A13 (in), 22 A12 (in), 23 NC, 24 A11 (in), 25 A10 (in), 26 A9 (in), 27 A8 (in), 28 NC, 29 DQ8 (io), 30 DQ9 (io), 31 DQ10 (io), 32 DQ11 (io), 33 VCC (power), 34 VSS (power), 35 DQ12 (io), 36 DQ13 (io), 37 DQ14 (io), 38 DQ15 (io), 39 ~{LB} (in), 40 ~{UB} (in), 41 ~{OE} (in), 42 A7 (in), 43 A6 (in), 44 A5 (in)

## AT24C01BN-SH
designator IC?
1K (128 x 8), 2-Wire Bus Serial EEPROM
pins: 1 A0 (in), 2 A1 (in), 3 A2 (in), 4 GND (power), 5 SDA (io), 6 SCL (in), 7 WP (in), 8 VCC (power)

## AT24C64AN-10SU
designator IC?
64K (8192 x 8), Two-Wire Serial EEPROM
pins: 1 A0 (in), 2 A1 (in), 3 A2 (in), 4 GND (power), 5 SDA (io), 6 SCL (in), 7 WP (in), 8 VCC (power)

## AT24C64D-SSH
designator IC?
64K (8192 x 8), I2C-Compatible (2-Wire) Serial EEPROM
pins: 1 A0 (in), 2 A1 (in), 3 A2 (in), 4 GND (power), 5 SDA (io), 6 SCL (in), 7 WP (in), 8 VCC (power)

## AT25DF041A-SSH
designator IC?
4M (524288x8) 2.7V High Speed Small Sectored SPI Flash Memory
pins: 1 ~{CS} (in), 2 SO (out), 3 ~{WP} (in), 4 GND (power), 5 SI (in), 6 SCK (in), 7 ~{HOLD} (in), 8 VCC (power)

## AT25DF321-S3U
designator IC?
32MBit 2.7V Minimum SPI Serial Flash Memory
pins: 1 ~{HOLD} (in), 2 VCC (power), 7 ~{CS} (in), 8 SO (out), 9 ~{WP} (in), 10 GND (power), 15 SI (in), 16 SCK (in)

## AT25F512B-SSH
designator IC?
512kBit 2.7V Minimum SPI Serial Flash Memory
pins: 1 ~{CS} (in), 2 SO (out), 3 ~{WP} (in), 4 GND (power), 5 SI (in), 6 SCK (in), 7 ~{HOLD} (in), 8 VCC (power)

## AT26DF081A
designator IC?
8MBit 2.7V Minimum SPI Serial Flash Memory
pins: 1 ~{CS} (in), 2 SO (out), 3 ~{WP} (in), 4 GND (power), 5 SI (in), 6 SCK (in), 7 ~{HOLD} (in), 8 VCC (power)

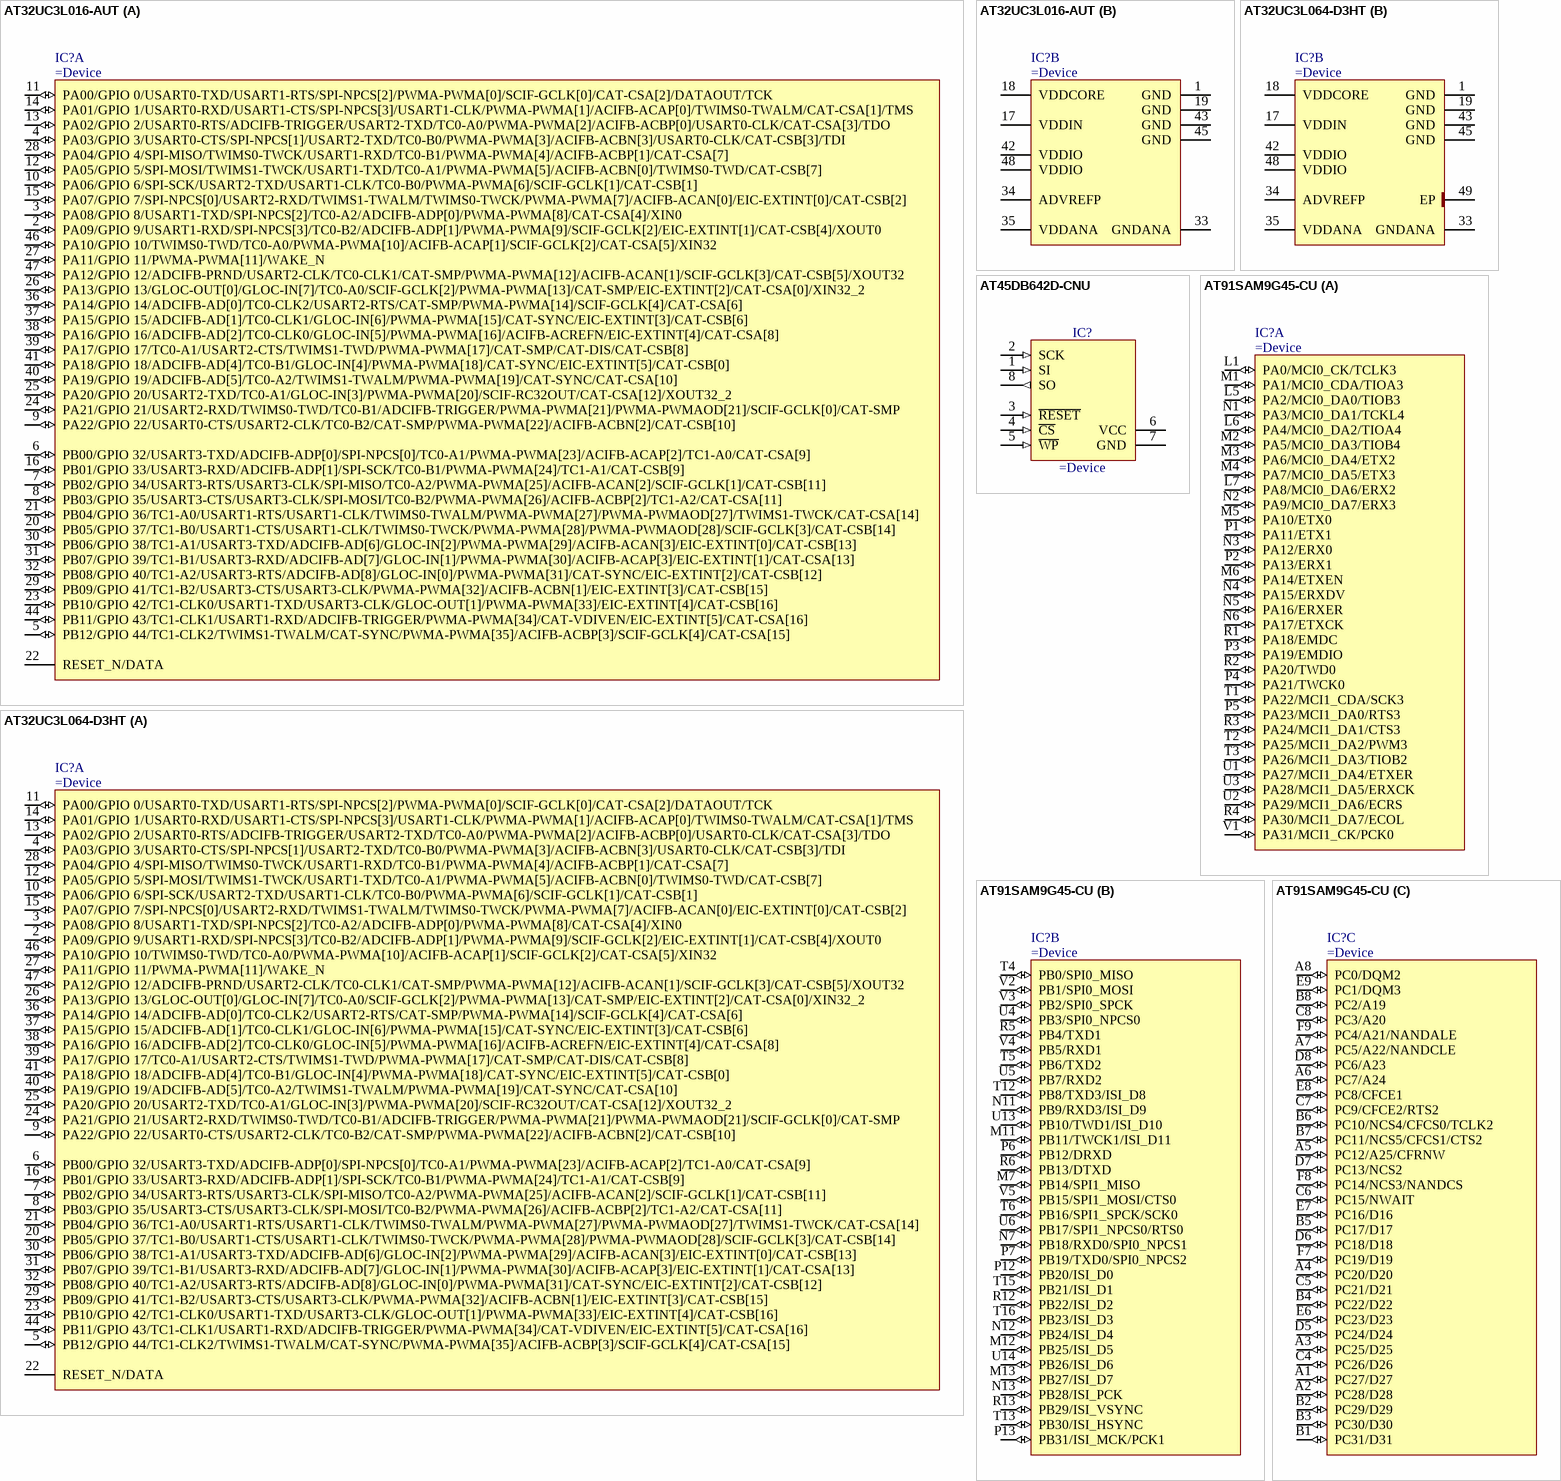
[diagram p28: symbols AT32UC3L016-AUT to AT91SAM9G45-CU]
